# Altium footprint library MyPcbLib.PcbLib: 237 footprints (part 4 of 15)
Each footprint in its own frame and in the unit in brackets; x right, y up, seen from the top. Pads: shape width x height; smd on the part's side, far side on the other; paste and mask are expansions set on the pad; w line width, h text height; cw(c..) or ccw(c..) is an arc to the next point about the centre after c.
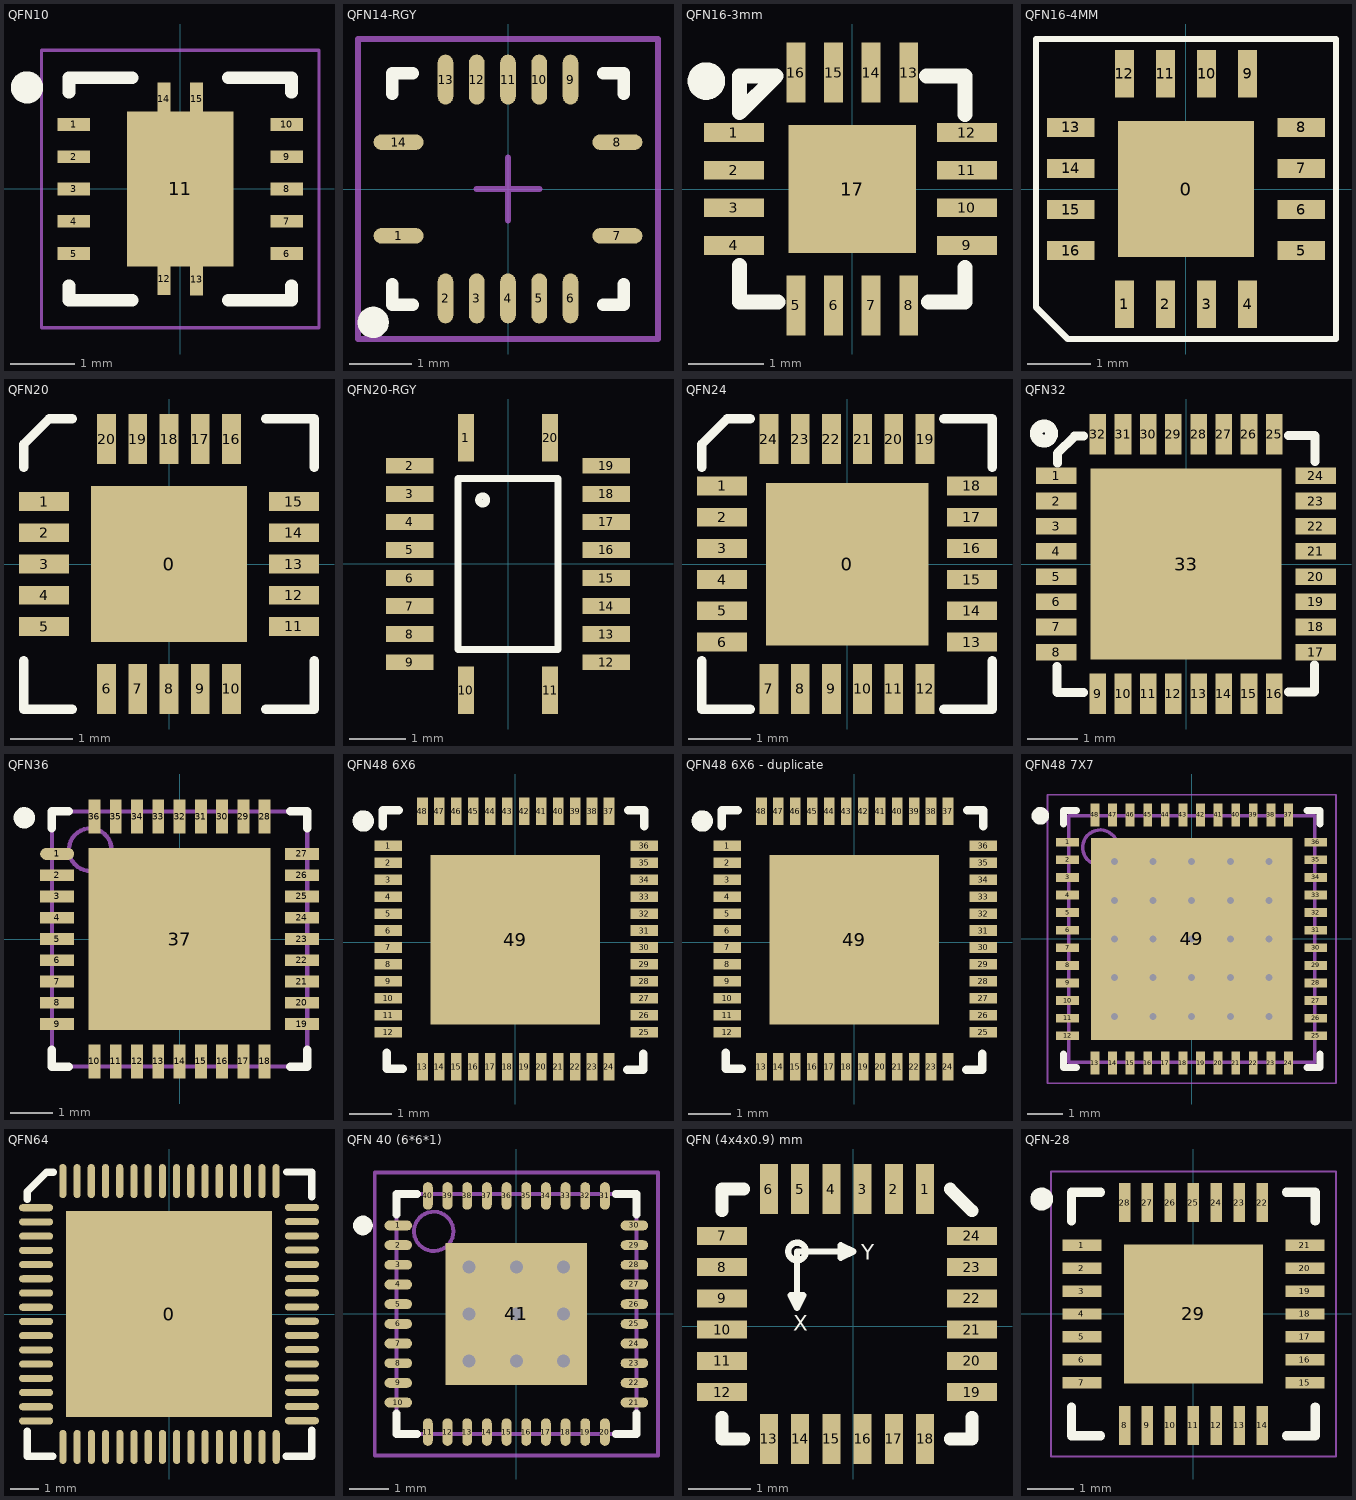
[diagram p3: the footprints below, top view; thin cyan lines are the x and y axes]

## QFN10 [mm] "QFN, 14-Leads, Body 3.00x3.00mm, Pitch 0.50mm, Thermal Pad 1.63x2.40mm, IPC Medium Density"
height 1
pads (15):
  rect 0.5x0.2 smd: 1(-1.65,1) 2(-1.65,0.5) 3(-1.65,0) 4(-1.65,-0.5) 5(-1.65,-1) 6(1.65,-1) 7(1.65,-0.5) 8(1.65,0) 9(1.65,0.5) 10(1.65,1)
  rect 1.65x2.4 smd: 11(0,0)
  rect 0.2x0.5 smd: 12(-0.25,-1.392) 13(0.254,-1.397) 14(-0.254,1.397) 15(0.254,1.397)
Top Overlay:
  circle w0.25: c-2.375,1.575 r0.125
  lines w0.2: -1.725,-1.5 -1.725,-1.725 -0.75,-1.725 ; -1.725,1.5 -1.725,1.725 -0.75,1.725 ; 0.75,-1.725 1.725,-1.725 1.725,-1.5 ; 0.75,1.725 1.725,1.725 1.725,1.5
Mechanical 15:
  lines w0.05: -2.15,-2.15 2.15,-2.15 2.15,2.15 -2.15,2.15 -2.15,-2.15
  lines w0.1: -0.5,0 0.5,0 ; 0,-0.5 0,0.5
3D body: height 1, standoff 0.05, extent -1.575,-1.575 1.575,1.575
3D body: height 0.2, standoff 0.05, extent 0.152,-1.6 0.33,-1.397
3D body: height 0.2, standoff 0.05, extent -0.343,-1.6 -0.165,-1.397
3D body: height 0.2, standoff 0.05, extent 0.152,1.397 0.33,1.6
3D body: height 0.2, standoff 0.05, extent -0.356,1.397 -0.178,1.6
3D body: height 0.2, standoff 0.05, extent 1.397,-1.092 1.6,-0.914
3D body: height 0.2, standoff 0.05, extent 1.397,-0.584 1.6,-0.406
3D body: height 0.2, standoff 0.05, extent 1.397,-0.076 1.6,0.102
3D body: height 0.2, standoff 0.05, extent 1.397,0.406 1.6,0.584
3D body: height 0.2, standoff 0.05, extent 1.397,0.914 1.6,1.092
3D body: height 0.2, standoff 0.05, extent -1.6,0.914 -1.397,1.092
3D body: height 0.2, standoff 0.05, extent -1.6,0.406 -1.397,0.584
3D body: height 0.2, standoff 0.05, extent -1.6,-0.102 -1.397,0.076
3D body: height 0.2, standoff 0.05, extent -1.6,-0.584 -1.397,-0.406
3D body: height 0.2, standoff 0.05, extent -1.6,-1.092 -1.397,-0.914

## QFN14-RGY [mm] "QFN14-RGY (LIB+=TXS0104E)"
height 1
pads (14):
  oval 0.8x0.25 smd: 1(-1.75,-0.75) 7(1.75,-0.75) 8(1.75,0.75) 14(-1.75,0.75)
  oval 0.25x0.8 smd: 2(-1,-1.75) 3(-0.5,-1.75) 4(0,-1.75) 5(0.5,-1.75) 6(1,-1.75) 9(1,1.75) 10(0.5,1.75) 11(0,1.75) 12(-0.5,1.75) 13(-1,1.75)
Top Overlay:
  circle w0.25: c-2.157,-2.134 r0.125
  lines w0.2: -1.85,-1.525 -1.85,-1.85 -1.525,-1.85 ; -1.85,1.525 -1.85,1.85 -1.525,1.85 ; 1.525,-1.85 1.85,-1.85 1.85,-1.525 ; 1.525,1.85 1.85,1.85 1.85,1.525
Mechanical 15:
  lines w0.1: -0.5,0 0.5,0 ; 0,-0.5 0,0.5 ; -2.4,-2.4 -2.4,2.4 2.4,2.4 2.4,-2.4 -2.4,-2.4
3D body "User Library-QFN-14_Therm.STEP": height 1, standoff 0, extent -1.753,-1.753 1.747,1.747

## QFN16-3mm [mm] "QFN, 16-Leads, Body 3.0x3.0mm (max), Pitch 0.50mm, IPC Low Density"
height 3
pads (17):
  rect 0.8x0.25 smd: 1(-1.575,0.75) 2(-1.575,0.25) 3(-1.575,-0.25) 4(-1.575,-0.75) 9(1.524,-0.75) 10(1.524,-0.25) 11(1.524,0.25) 12(1.524,0.75)
  rect 0.25x0.8 smd: 5(-0.75,-1.55) 6(-0.25,-1.55) 7(0.25,-1.55) 8(0.75,-1.55) 13(0.75,1.55) 14(0.25,1.55) 15(-0.25,1.55) 16(-0.75,1.55)
  rect 1.7x1.7 smd: 17(0,0)
Top Overlay:
  circle w0.25: c-1.941,1.436 r0.125
  lines w0.2: -1.5,-1.015 -1.5,-1.5 -0.989,-1.5 ; 0.989,1.5 1.5,1.5 1.5,0.989 ; 1.016,-1.5 1.5,-1.5 1.5,-1.041 ; -1.5,1.016 -1.5,1.5 -1.016,1.5 -1.5,1.016
3D body "QFN-16_3x3.STEP": height 0.9, standoff 0, extent -1.549,-1.521 1.493,1.521

## QFN16-4MM [mm] "LNA"
height 5.33
pads (17):
  rect 2.15x2.15 smd: 0(0,0)
  rect 0.3x0.75 smd: 1(-0.975,-1.825) 2(-0.325,-1.825) 3(0.325,-1.825) 4(0.975,-1.825) 9(0.975,1.825) 10(0.325,1.825) 11(-0.325,1.825) 12(-0.975,1.825)
  rect 0.75x0.3 smd: 5(1.825,-0.975) 6(1.825,-0.325) 7(1.825,0.325) 8(1.825,0.975) 13(-1.825,0.975) 14(-1.825,0.325) 15(-1.825,-0.325) 16(-1.825,-0.975)
Top Overlay:
  lines w0.1: -1.025,2.375 2.375,2.375 2.375,-2.375 -1.525,-2.375 -1.875,-2.375 -2.375,-1.875 -2.375,-1.425 -2.375,2.375 -0.4,2.375
3D body "QFN16.step": height 0.85, standoff 0, extent -2.001,-1.981 2.001,2.021

## QFN20 [mm]
pads (21):
  rect 2.5x2.5 smd: 0(0,0)
  rect 0.8x0.3 smd: 1(-2,1) 2(-2,0.5) 3(-2,0) 4(-2,-0.5) 5(-2,-1) 11(2,-1) 12(2,-0.5) 13(2,0) 14(2,0.5) 15(2,1)
  rect 0.3x0.8 smd: 6(-1,-2) 7(-0.5,-2) 8(0,-2) 9(0.5,-2) 10(1,-2) 16(1,2) 17(0.5,2) 18(0,2) 19(-0.5,2) 20(-1,2)
Top Overlay:
  lines w0.15: -2.325,-1.55 -2.325,-2.325 -1.55,-2.325 ; -2.325,1.55 -2.325,1.917 -1.917,2.325 -1.55,2.325 ; 1.55,-2.325 2.325,-2.325 2.325,-1.55 ; 1.55,2.325 2.325,2.325 2.325,1.55
3D body "QFN-20.STEP": height 0.62, standoff -0.08, extent -1.501,-1.5 1.499,1.5

## QFN20-RGY [mm]
pads (20):
  rect 0.28x0.85 smd: 1(-0.75,2.25) 10(-0.75,-2.25) 11(0.75,-2.25) 20(0.75,2.25)
  rect 0.85x0.28 smd: 2(-1.75,1.75) 3(-1.75,1.25) 4(-1.75,0.75) 5(-1.75,0.25) 6(-1.75,-0.25) 7(-1.75,-0.75) 8(-1.75,-1.25) 9(-1.75,-1.75) 12(1.75,-1.75) 13(1.75,-1.25) 14(1.75,-0.75) 15(1.75,-0.25) 16(1.75,0.25) 17(1.75,0.75) 18(1.75,1.25) 19(1.75,1.75)
Top Overlay:
  circle w0.127: c-0.452,1.143 r0.071
  lines w0.127: -0.889,-1.524 0.889,-1.524 0.889,1.524 -0.889,1.524 -0.889,-1.524
3D body "User Library-DHVQFN20.STEP": height 1, standoff 0, extent -1.22,-2.26 1.3,2.26

## QFN24 [mm]
pads (25):
  rect 2.6x2.6 smd: 0(0.005,0)
  rect 0.8x0.3 smd: 1(-2,1.25) 2(-2,0.75) 3(-2,0.25) 4(-2,-0.25) 5(-2,-0.75) 6(-2,-1.25) 13(2,-1.25) 14(2,-0.75) 15(2,-0.25) 16(2,0.25) 17(2,0.75) 18(2,1.25)
  rect 0.3x0.8 smd: 7(-1.25,-2) 8(-0.75,-2) 9(-0.25,-2) 10(0.25,-2) 11(0.75,-2) 12(1.25,-2) 19(1.25,2) 20(0.75,2) 21(0.25,2) 22(-0.25,2) 23(-0.75,2) 24(-1.25,2)
Top Overlay:
  lines w0.15: -2.325,-1.55 -2.325,-2.325 -1.55,-2.325 ; -2.325,1.55 -2.325,1.917 -1.917,2.325 -1.55,2.325 ; 1.55,-2.325 2.325,-2.325 2.325,-1.55 ; 1.55,2.325 2.325,2.325 2.325,1.55
3D body "QFN24.step": height 0.9, standoff 0, extent -1.997,-2.002 2.007,2.002

## QFN32 [mil]
pads (33):
  rect 31.5x13 smd: 1(-101.5,68.92) 2(-101.5,49.23) 3(-101.5,29.54) 4(-101.5,9.85) 5(-101.5,-9.85) 6(-101.5,-29.54) 7(-101.5,-49.23) 8(-101.5,-68.92) 17(101.5,-68.92) 18(101.5,-49.23) 19(101.5,-29.54) 20(101.5,-9.85) 21(101.5,9.85) 22(101.5,29.54) 23(101.5,49.23) 24(101.5,68.92)
  rect 13x31.5 smd: 9(-68.92,-101.5) 10(-49.23,-101.5) 11(-29.54,-101.5) 12(-9.85,-101.5) 13(9.85,-101.5) 14(29.54,-101.5) 15(49.23,-101.5) 16(68.92,-101.5) 25(68.92,101.5) 26(49.23,101.5) 27(29.54,101.5) 28(9.85,101.5) 29(-9.85,101.5) 30(-29.54,101.5) 31(-49.23,101.5) 32(-68.92,101.5)
  rect 149.61x149.61 smd: 33(0,0)
Top Overlay:
  circle w10: c-111,102 r6
  lines w7: -101,-80 -101,-100 -100.5,-100.5 -80,-100.5 ; -100.5,79 -100.5,86.5 -87,100 -80,100 ; 80,-100 100,-100 100.5,-99.5 100.5,-79 ; 80,100.5 100.5,100.5 101,100 101,80
3D body "qfn32-5x5.step": height 31.5, standoff 0, extent -98.2,-98.81 99.44,98.82

## QFN36 [mm] "PQFN, 36-Leads, Body 6.00x6.00mm, Pitch 0.50mm, Thermal Pad 4.28x4.28mm, IPC Medium Density"
height 1
pads (37):
  oval 0.8x0.28 smd: 1(-2.879,2)
  rect 0.8x0.28 smd: 2(-2.879,1.5) 3(-2.879,1) 4(-2.879,0.5) 5(-2.879,0) 6(-2.879,-0.5) 7(-2.879,-1) 8(-2.879,-1.5) 9(-2.879,-2) 19(2.879,-2) 20(2.879,-1.5) 21(2.879,-1) 22(2.879,-0.5) 23(2.879,0) 24(2.879,0.5) 25(2.879,1) 26(2.879,1.5) 27(2.879,2)
  rect 0.28x0.8 smd: 10(-2,-2.879) 11(-1.5,-2.879) 12(-1,-2.879) 13(-0.5,-2.879) 14(0,-2.879) 15(0.5,-2.879) 16(1,-2.879) 17(1.5,-2.879) 18(2,-2.879) 28(2,2.879) 29(1.5,2.879) 30(1,2.879) 31(0.5,2.879) 32(0,2.879) 33(-0.5,2.879) 34(-1,2.879) 35(-1.5,2.879) 36(-2,2.879)
  rect 4.28x4.28 smd: 37(0,0)
Top Overlay:
  circle w0.25: c-3.65,2.85 r0.125
  lines w0.2: -3,-2.6 -3,-3 -2.6,-3 ; -3,2.6 -3,3 -2.6,3 ; 2.6,-3 3,-3 3,-2.6 ; 2.6,3 3,3 3,2.6
Mechanical 13:
  circle w0.1: c-2.1,2.1 r0.5
  lines w0.1: -3,-3 -3,3 3,3 3,-3 -3,-3
3D body "QFN36 6x6.STEP": height 0.9, standoff 0.01, extent -3.102,-3.102 3.103,3.103

## QFN48 6X6 [mm] "QFN, 48-Leads, Body 7.00x7.00mm, Pitch 0.50mm, Thermal Pad 5.73x5.73mm, IPC Medium Density"
height 1
pads (49):
  rect 0.65x0.25 smd: 1(-2.997,2.271) 2(-2.997,1.871) 3(-2.997,1.471) 4(-2.997,1.071) 5(-2.997,0.671) 6(-2.997,0.271) 7(-2.997,-0.129) 8(-2.997,-0.529) 9(-2.997,-0.929) 10(-2.997,-1.329) 11(-2.997,-1.729) 12(-2.997,-2.129) 25(3.048,-2.129) 26(3.048,-1.729) 27(3.048,-1.329) 28(3.048,-0.929) 29(3.048,-0.529) 30(3.048,-0.129) 31(3.048,0.271) 32(3.048,0.671) 33(3.048,1.071) 34(3.048,1.471) 35(3.048,1.871) 36(3.048,2.271)
  rect 0.25x0.65 smd: 13(-2.184,-2.941) 14(-1.784,-2.941) 15(-1.384,-2.941) 16(-0.984,-2.941) 17(-0.584,-2.941) 18(-0.184,-2.941) 19(0.216,-2.941) 20(0.616,-2.941) 21(1.016,-2.941) 22(1.416,-2.941) 23(1.816,-2.941) 24(2.216,-2.941) 37(2.216,3.083) 38(1.816,3.083) 39(1.416,3.083) 40(1.016,3.083) 41(0.616,3.083) 42(0.216,3.083) 43(-0.184,3.083) 44(-0.584,3.083) 45(-0.984,3.083) 46(-1.384,3.083) 47(-1.784,3.083) 48(-2.184,3.083)
  rect 4x4 smd: 49(0,0.055)
Top Overlay:
  circle w0.25: c-3.581,2.855 r0.125
  lines w0.2: -3.118,2.734 -3.118,3.109 -2.743,3.109 ; -3.023,-2.612 -3.023,-2.987 -2.648,-2.987 ; 2.648,-3.013 3.023,-3.013 3.023,-2.638 ; 2.673,3.109 3.048,3.109 3.048,2.734
3D body "QFN48.step": height 0.85, standoff -0.02, extent -2.992,-2.931 3.048,3.109

## QFN48 6X6 - duplicate [mm] "QFN, 48-Leads, Body 7.00x7.00mm, Pitch 0.50mm, Thermal Pad 5.73x5.73mm, IPC Medium Density"
height 1
pads (49):
  rect 0.65x0.25 smd: 1(-2.997,2.271) 2(-2.997,1.871) 3(-2.997,1.471) 4(-2.997,1.071) 5(-2.997,0.671) 6(-2.997,0.271) 7(-2.997,-0.129) 8(-2.997,-0.529) 9(-2.997,-0.929) 10(-2.997,-1.329) 11(-2.997,-1.729) 12(-2.997,-2.129) 25(3.048,-2.129) 26(3.048,-1.729) 27(3.048,-1.329) 28(3.048,-0.929) 29(3.048,-0.529) 30(3.048,-0.129) 31(3.048,0.271) 32(3.048,0.671) 33(3.048,1.071) 34(3.048,1.471) 35(3.048,1.871) 36(3.048,2.271)
  rect 0.25x0.65 smd: 13(-2.184,-2.941) 14(-1.784,-2.941) 15(-1.384,-2.941) 16(-0.984,-2.941) 17(-0.584,-2.941) 18(-0.184,-2.941) 19(0.216,-2.941) 20(0.616,-2.941) 21(1.016,-2.941) 22(1.416,-2.941) 23(1.816,-2.941) 24(2.216,-2.941) 37(2.216,3.083) 38(1.816,3.083) 39(1.416,3.083) 40(1.016,3.083) 41(0.616,3.083) 42(0.216,3.083) 43(-0.184,3.083) 44(-0.584,3.083) 45(-0.984,3.083) 46(-1.384,3.083) 47(-1.784,3.083) 48(-2.184,3.083)
  rect 4x4 smd: 49(0,0.055)
Top Overlay:
  circle w0.25: c-3.581,2.855 r0.125
  lines w0.2: -3.118,2.734 -3.118,3.109 -2.743,3.109 ; -3.023,-2.612 -3.023,-2.987 -2.648,-2.987 ; 2.648,-3.013 3.023,-3.013 3.023,-2.638 ; 2.673,3.109 3.048,3.109 3.048,2.734
3D body "QFN48.step": height 0.85, standoff -0.02, extent -2.992,-2.931 3.048,3.109

## QFN48 7X7 [mm] "QFN, 48-Leads, Body 7.00x7.00mm, Pitch 0.50mm, Thermal Pad 5.73x5.73mm, IPC Medium Density"
height 1
pads (49):
  rect 0.65x0.25 smd: 1(-3.525,2.75) 2(-3.525,2.25) 3(-3.525,1.75) 4(-3.525,1.25) 5(-3.525,0.75) 6(-3.525,0.25) 7(-3.525,-0.25) 8(-3.525,-0.75) 9(-3.525,-1.25) 10(-3.525,-1.75) 11(-3.525,-2.25) 12(-3.525,-2.75) 25(3.525,-2.75) 26(3.525,-2.25) 27(3.525,-1.75) 28(3.525,-1.25) 29(3.525,-0.75) 30(3.525,-0.25) 31(3.525,0.25) 32(3.525,0.75) 33(3.525,1.25) 34(3.525,1.75) 35(3.525,2.25) 36(3.525,2.75)
  rect 0.25x0.65 smd: 13(-2.75,-3.525) 14(-2.25,-3.525) 15(-1.75,-3.525) 16(-1.25,-3.525) 17(-0.75,-3.525) 18(-0.25,-3.525) 19(0.25,-3.525) 20(0.75,-3.525) 21(1.25,-3.525) 22(1.75,-3.525) 23(2.25,-3.525) 24(2.75,-3.525) 37(2.75,3.525) 38(2.25,3.525) 39(1.75,3.525) 40(1.25,3.525) 41(0.75,3.525) 42(0.25,3.525) 43(-0.25,3.525) 44(-0.75,3.525) 45(-1.25,3.525) 46(-1.75,3.525) 47(-2.25,3.525) 48(-2.75,3.525)
  rect 5.73x5.73 smd: 49(0,0)
via -2.2,2.2 diameter 0.5 hole 0.2
via -1.1,2.2 diameter 0.5 hole 0.2
via 0,2.2 diameter 0.5 hole 0.2
via 1.1,2.2 diameter 0.5 hole 0.2
via 2.2,2.2 diameter 0.5 hole 0.2
via -2.2,1.1 diameter 0.5 hole 0.2
via -1.1,1.1 diameter 0.5 hole 0.2
via 0,1.1 diameter 0.5 hole 0.2
via 1.1,1.1 diameter 0.5 hole 0.2
via 2.2,1.1 diameter 0.5 hole 0.2
via -2.2,0 diameter 0.5 hole 0.2
via -1.1,0 diameter 0.5 hole 0.2
via 0,0 diameter 0.5 hole 0.2
via 1.1,0 diameter 0.5 hole 0.2
via 2.2,0 diameter 0.5 hole 0.2
via -2.2,-1.1 diameter 0.5 hole 0.2
via -1.1,-1.1 diameter 0.5 hole 0.2
via 0,-1.1 diameter 0.5 hole 0.2
via 1.1,-1.1 diameter 0.5 hole 0.2
via 2.2,-1.1 diameter 0.5 hole 0.2
via -2.2,-2.2 diameter 0.5 hole 0.2
via -1.1,-2.2 diameter 0.5 hole 0.2
via 0,-2.2 diameter 0.5 hole 0.2
via 1.1,-2.2 diameter 0.5 hole 0.2
via 2.2,-2.2 diameter 0.5 hole 0.2
Top Overlay:
  circle w0.25: c-4.3,3.5 r0.125
  lines w0.2: -3.65,-3.275 -3.65,-3.65 -3.275,-3.65 ; -3.65,3.275 -3.65,3.65 -3.275,3.65 ; 3.275,-3.65 3.65,-3.65 3.65,-3.275 ; 3.275,3.65 3.65,3.65 3.65,3.275
Mechanical 13:
  circle w0.1: c-2.6,2.6 r0.5
  lines w0.1: -3.5,-3.5 -3.5,3.5 3.5,3.5 3.5,-3.5 -3.5,-3.5
Mechanical 15:
  lines w0.05: -4.1,-4.1 -4.1,4.1 4.1,4.1 4.1,-4.1 -4.1,-4.1
  lines w0.1: -0.5,0 0.5,0 ; 0,-0.5 0,0.5
3D body: height 1, standoff 0.08, extent -3.5,-3.556 3.5,3.444

## QFN64 [mm]
pads (65):
  rect 7.25x7.25 smd: 0(0,-0.001)
  oval 1.2x0.25 smd: 1(-4.674,3.738) 2(-4.674,3.238) 3(-4.674,2.738) 4(-4.674,2.238) 5(-4.674,1.738) 6(-4.674,1.238) 7(-4.674,0.738) 8(-4.674,0.238) 9(-4.674,-0.262) 10(-4.674,-0.762) 11(-4.674,-1.262) 12(-4.674,-1.762) 13(-4.674,-2.262) 14(-4.674,-2.762) 15(-4.674,-3.262) 16(-4.674,-3.762) 33(4.674,-3.754) 34(4.674,-3.254) 35(4.674,-2.754) 36(4.674,-2.254) 37(4.674,-1.754) 38(4.674,-1.254) 39(4.674,-0.754) 40(4.674,-0.254) 41(4.674,0.246) 42(4.674,0.746) 43(4.674,1.246) 44(4.674,1.746) 45(4.674,2.246) 46(4.674,2.746) 47(4.674,3.246) 48(4.674,3.746)
  oval 0.25x1.2 smd: 17(-3.73,-4.675) 18(-3.23,-4.675) 19(-2.73,-4.675) 20(-2.23,-4.675) 21(-1.73,-4.675) 22(-1.23,-4.675) 23(-0.73,-4.675) 24(-0.23,-4.675) 25(0.27,-4.675) 26(0.77,-4.675) 27(1.27,-4.675) 28(1.77,-4.675) 29(2.27,-4.675) 30(2.77,-4.675) 31(3.27,-4.675) 32(3.77,-4.675) 49(3.767,4.675) 50(3.267,4.675) 51(2.767,4.675) 52(2.267,4.675) 53(1.767,4.675) 54(1.267,4.675) 55(0.767,4.675) 56(0.267,4.675) 57(-0.233,4.675) 58(-0.733,4.675) 59(-1.233,4.675) 60(-1.733,4.675) 61(-2.233,4.675) 62(-2.733,4.675) 63(-3.233,4.675) 64(-3.733,4.675)
Top Overlay:
  lines w0.254: -4.983,-4.116 -4.983,-5.004 -4.089,-5.004 ; -4.983,4.032 -4.983,4.312 -4.31,4.985 -4.064,4.985 ; 4.115,-5.004 5.017,-5.004 5.017,-4.091 ; 4.14,4.995 5.017,4.996 5.017,4.113
3D body "User Library-QFN64-2.step": height 0.9, standoff 0, extent -4.52,-4.521 4.52,4.519

## QFN 40 (6*6*1) [mm] "QFN, 40-Leads, Body 6.1x6.1mm (max), Pitch 0.50mm, IPC Medium Density"
height 1
pads (41):
  oval 0.7x0.25 smd: 1(-3,2.25) 2(-3,1.75) 3(-3,1.25) 4(-3,0.75) 5(-3,0.25) 6(-3,-0.25) 7(-3,-0.75) 8(-3,-1.25) 9(-3,-1.75) 10(-3,-2.25) 21(3,-2.25) 22(3,-1.75) 23(3,-1.25) 24(3,-0.75) 25(3,-0.25) 26(3,0.25) 27(3,0.75) 28(3,1.25) 29(3,1.75) 30(3,2.25)
  oval 0.25x0.7 smd: 11(-2.25,-3) 12(-1.75,-3) 13(-1.25,-3) 14(-0.75,-3) 15(-0.25,-3) 16(0.25,-3) 17(0.75,-3) 18(1.25,-3) 19(1.75,-3) 20(2.25,-3) 31(2.25,3) 32(1.75,3) 33(1.25,3) 34(0.75,3) 35(0.25,3) 36(-0.25,3) 37(-0.75,3) 38(-1.25,3) 39(-1.75,3) 40(-2.25,3)
  rect 3.6x3.6 smd: 41(0,0)
via -1.2,1.2 diameter 0.66 hole 0.33
via 0,1.2 diameter 0.66 hole 0.33
via 1.2,1.2 diameter 0.66 hole 0.33
via -1.2,0 diameter 0.66 hole 0.33
via 0,0 diameter 0.66 hole 0.33
via 1.2,0 diameter 0.66 hole 0.33
via -1.2,-1.2 diameter 0.66 hole 0.33
via 0,-1.2 diameter 0.66 hole 0.33
via 1.2,-1.2 diameter 0.66 hole 0.33
Top Overlay:
  circle w0.25: c-3.9,2.25 r0.125
  lines w0.2: -3.05,-2.525 -3.05,-3.05 -2.525,-3.05 ; -3.05,2.525 -3.05,3.05 -2.525,3.05 ; 2.525,-3.05 3.05,-3.05 3.05,-2.525 ; 2.525,3.05 3.05,3.05 3.05,2.525
Mechanical 13:
  circle w0.1: c-2.1,2.1 r0.5
  lines w0.1: -3.05,-3.05 -3.05,3.05 3.05,3.05 3.05,-3.05 -3.05,-3.05
Mechanical 15:
  lines w0.1: -0.5,0 0.5,0 ; 0,-0.5 0,0.5 ; -3.6,-3.6 -3.6,3.6 3.6,3.6 3.6,-3.6 -3.6,-3.6
3D body "User Library-QFN40 (6x6).step": height 0.9, standoff 0, extent -3,-2.997 3,3.003

## QFN (4x4x0.9) mm [mm] "QFN PACKAGE [MPU6000]"
pads (24):
  rect 0.29x0.8 smd: 1(1.146,2.195) 2(0.646,2.195) 3(0.146,2.195) 4(-0.354,2.195) 5(-0.854,2.195) 6(-1.354,2.195) 13(-1.354,-1.805) 14(-0.854,-1.805) 15(-0.354,-1.805) 16(0.146,-1.805) 17(0.646,-1.805) 18(1.146,-1.805)
  rect 0.8x0.29 smd: 7(-2.104,1.445) 8(-2.104,0.945) 9(-2.104,0.445) 10(-2.104,-0.055) 11(-2.104,-0.555) 12(-2.104,-1.055) 19(1.896,-1.055) 20(1.896,-0.555) 21(1.896,-0.055) 22(1.896,0.445) 23(1.896,0.945) 24(1.896,1.445)
Top Overlay:
  circle w0.1: c-0.904,1.195 r0.141
  lines w0.1: -0.904,0.295 -0.804,0.495 -1.004,0.495 -0.904,0.295 ; -0.904,0.295 -0.904,1.195 -0.004,1.195 ; -0.004,1.195 -0.204,1.095 -0.204,1.295 -0.004,1.195
  lines w0.203: -2.104,-1.455 -2.104,-1.805 -1.754,-1.805 ; -2.104,1.845 -2.104,2.195 -1.754,2.195 ; 1.546,-1.805 1.896,-1.805 1.896,-1.455 ; 1.546,2.195 1.896,1.845
  text "X" at -0.965,-0.076 h0.25
  text "Y" at 0.127,1.067 h0.25
3D body "User Library-QFN 24 4x4.STEP": height 0.9, standoff 0, extent -2.09,-1.85 1.914,2.154

## QFN-28 [mm] "QFN, 28-Leads, Body 5.00x5.00mm, Pitch 0.50mm, Thermal Pad 3.03x3.03mm, IPC Medium Density"
height 0.9
pads (29):
  rect 0.85x0.25 smd: 1(-2.425,1.5) 2(-2.425,1) 3(-2.425,0.5) 4(-2.425,0) 5(-2.425,-0.5) 6(-2.425,-1) 7(-2.425,-1.5) 15(2.425,-1.5) 16(2.425,-1) 17(2.425,-0.5) 18(2.425,0) 19(2.425,0.5) 20(2.425,1) 21(2.425,1.5)
  rect 0.25x0.85 smd: 8(-1.5,-2.425) 9(-1,-2.425) 10(-0.5,-2.425) 11(0,-2.425) 12(0.5,-2.425) 13(1,-2.425) 14(1.5,-2.425) 22(1.5,2.425) 23(1,2.425) 24(0.5,2.425) 25(0,2.425) 26(-0.5,2.425) 27(-1,2.425) 28(-1.5,2.425)
  rect 3.03x3.03 smd: 29(0,0)
Top Overlay:
  circle w0.25: c-3.3,2.5 r0.125
  lines w0.2: -2.65,-2.025 -2.65,-2.65 -2.025,-2.65 ; -2.65,2.025 -2.65,2.65 -2.025,2.65 ; 2.025,-2.65 2.65,-2.65 2.65,-2.025 ; 2.025,2.65 2.65,2.65 2.65,2.025
Mechanical 15:
  lines w0.05: -3.1,-3.1 -3.1,3.1 3.1,3.1 3.1,-3.1 -3.1,-3.1
  lines w0.1: -0.5,0 0.5,0 ; 0,-0.5 0,0.5
3D body "User Library-QFN28.STEP": height 0.9, standoff 0, extent -2.5,-2.525 2.54,2.515